# Altium footprint library XU-GENARAL PCB .PcbLib: 1176 footprints (part 13 of 75)
Each footprint in its own frame and in the unit in brackets; x right, y up, seen from the top. Pads: shape width x height; smd on the part's side, far side on the other; paste and mask are expansions set on the pad; w line width, h text height; cw(c..) or ccw(c..) is an arc to the next point about the centre after c.
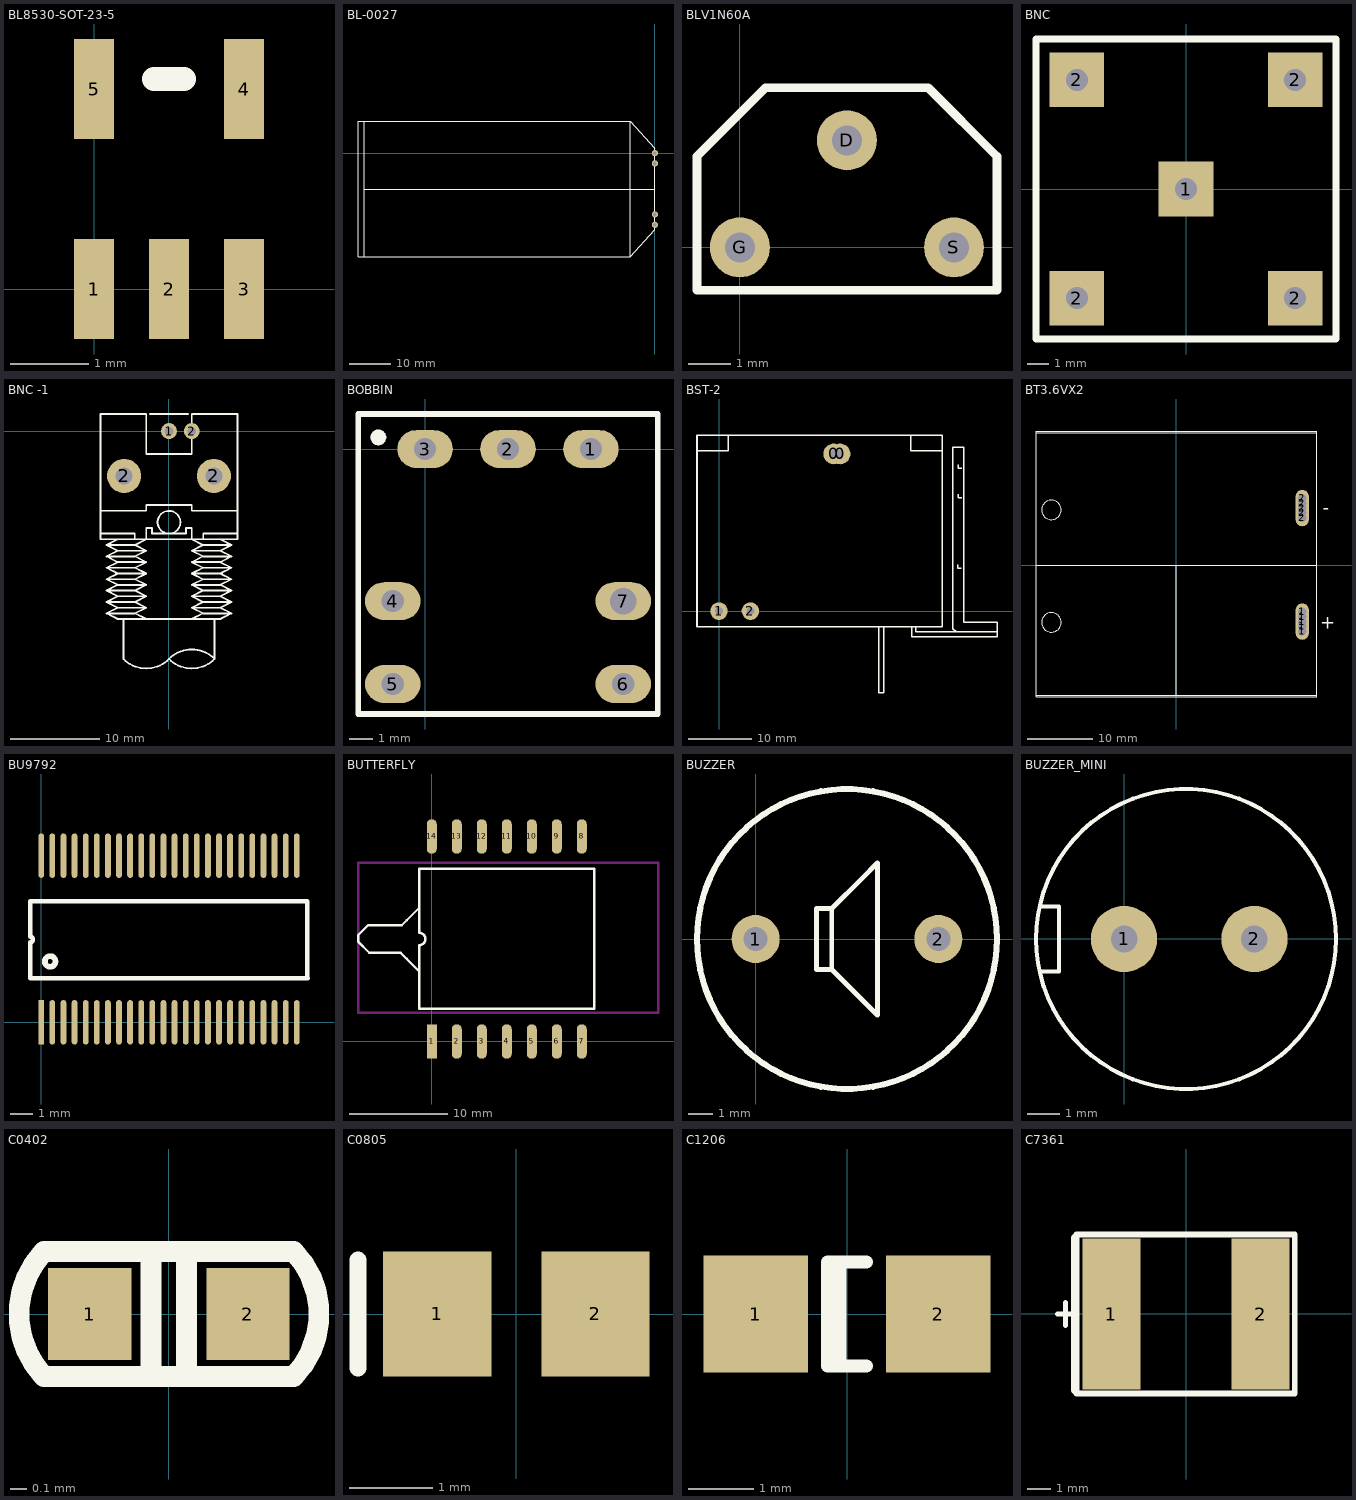
[diagram p12: the footprints below, top view; thin cyan lines are the x and y axes]

## BL8530-SOT-23-5 [mil]
pads (5):
  rect 20x50 smd: 1(0,0) 2(37.5,0) 3(75,0) 4(75,100) 5(0,100)
Top Overlay:
  lines w12: 30,105 45,105

## BL-0027 [mil]
pads (4):
  round 60 hole 35: A(0,-690) A(0,0) K(0,-590) K(0,-100)
Top Overlay:
  lines w10: -2795.28,-345.39 0,-345.39 ; -2795.28,304.21 -2795.28,-995 ; -2795.28,-995 -236.22,-995 ; -2795.28,-995 -2854.33,-995 -2854.33,304.21 -236.22,304.21 ; -236.22,-995 0,-739.09 0,-345.39 ; -236.22,-995 -236.22,304.21 ; -236.22,304.21 0,48.31 0,-345.39
Bottom Overlay:
  lines w10: -2853.43,-739.09 -2657.48,-739.09 -2657.48,-345.39 -2657.48,48.31 -2852.64,48.31 -2852.64,-738.31 ; -433.07,-739.09 -433.07,48.31 -236.22,48.31 -236.22,-739.09 -433.07,-739.09

## BLV1N60A [mil]
pads (3):
  round 56 hole 28: D(100,100) G(0,0) S(200,0)
Top Overlay:
  lines w8: -40,-40 240.16,-40 240.16,40 240.16,84.84 176,149 24,149 -40,85 -40,-40

## BNC [mil]
pads (5):
  rect 100x100 hole 40: 1(0,0) 2(-200,-200) 2(-200,200) 2(200,-200) 2(200,200)
Top Overlay:
  lines w12: -275,-275 275,-275 275,275 -275,275 -275,-275

## BNC -1 [mil]
height 43.31
pads (4):
  round 70 hole 38: 1(0.06,-0.03) 2(100.06,-0.03)
  round 150 hole 74.8: 2(-196.79,-196.88) 2(196.91,-196.88)
Top Overlay:
  circle w8: c0.06,-400.03 r50
  lines w8: -299.94,-450.03 -149.94,-450.03 -149.94,-475.03 ; -299.94,-350.03 -99.94,-350.03 -99.94,-325.03 100.06,-325.03 100.06,-350.03 300.06,-350.03 ; -224.94,-475.03 -274.94,-500.03 ; -200.11,-1000.2 ccw(c-99.94,-900.03) 0.24,-1000.2 ; -199.94,-1000.03 -199.94,-825.03 ; -83.27,74.97 83.4,74.97 ; -0.11,-1000.2 ccw(c100.06,-900.03) 200.24,-1000.2 ; -0.11,-999.86 cw(c100.06,-1100.03) 200.24,-999.86 ; 150.06,-475.03 150.06,-450.03 300.06,-450.03 ; 200.06,-1000.03 200.06,-825.03 ; 225.06,-475.03 275.06,-500.03 ; -274.94,-800.03 -224.94,-775.03 ; -274.94,-800.03 -224.94,-825.03 ; -274.94,-800.03 -149.94,-800.03 ; -274.94,-750.03 -224.94,-725.03 ; -274.94,-750.03 -224.94,-775.03 ; -274.94,-750.03 -149.94,-750.03 ; -274.94,-700.03 -224.94,-675.03 ; -274.94,-700.03 -224.94,-725.03 ; -274.94,-700.03 -149.94,-700.03 ; -274.94,-650.03 -224.94,-625.03 ; -274.94,-650.03 -224.94,-675.03 ; -274.94,-650.03 -149.94,-650.03 ; -274.94,-600.03 -224.94,-575.03 ; -274.94,-600.03 -224.94,-625.03 ; -274.94,-600.03 -149.94,-600.03 ; -274.94,-550.03 -224.94,-525.03 ; -274.94,-550.03 -224.94,-575.03 ; -274.94,-550.03 -149.94,-550.03 ; -274.94,-500.03 -224.94,-525.03 ; -274.94,-500.03 -149.94,-500.03 ; -224.94,-825.03 225.06,-825.03 ; -224.94,-825.03 -99.94,-825.03 -149.94,-800.03 ; -224.94,-775.03 -99.94,-775.03 ; -224.94,-725.03 -99.94,-725.03 ; -224.94,-675.03 -99.94,-675.03 ; -224.94,-625.03 -99.94,-625.03 ; -224.94,-575.03 -99.94,-575.03 ; -224.94,-525.03 -99.94,-525.03 ; -149.94,-800.03 -99.94,-775.03 ; -149.94,-750.03 -99.94,-725.03 ; -149.94,-750.03 -99.94,-775.03 ; -149.94,-700.03 -99.94,-675.03 ; -149.94,-700.03 -99.94,-725.03 ; -149.94,-650.03 -99.94,-625.03 ; -149.94,-650.03 -99.94,-675.03 ; -149.94,-600.03 -99.94,-575.03 ; -149.94,-600.03 -99.94,-625.03 ; -149.94,-550.03 -99.94,-525.03 ; -149.94,-550.03 -99.94,-575.03 ; -149.94,-500.03 -99.94,-475.03 -99.94,-425.03 -74.94,-425.03 -74.94,-450.03 75.06,-450.03 75.06,-425.03 100.06,-425.03 100.06,-475.03 150.06,-500.03 ; -149.94,-500.03 -99.94,-525.03 ; 100.06,-775.03 150.06,-750.03 ; 100.06,-775.03 150.06,-800.03 ; 100.06,-775.03 225.06,-775.03 ; 100.06,-725.03 150.06,-700.03 ; 100.06,-725.03 150.06,-750.03 ; 100.06,-725.03 225.06,-725.03 ; 100.06,-675.03 150.06,-650.03 ; 100.06,-675.03 150.06,-700.03 ; 100.06,-675.03 225.06,-675.03 ; 100.06,-625.03 150.06,-600.03 ; 100.06,-625.03 150.06,-650.03 ; 100.06,-625.03 225.06,-625.03 ; 100.06,-575.03 150.06,-550.03 ; 100.06,-575.03 150.06,-600.03 ; 100.06,-575.03 225.06,-575.03 ; 100.06,-525.03 150.06,-500.03 ; 100.06,-525.03 150.06,-550.03 ; 100.06,-525.03 225.06,-525.03 ; 150.06,-800.03 100.06,-825.03 225.06,-825.03 ; 150.06,-800.03 275.06,-800.03 ; 150.06,-750.03 275.06,-750.03 ; 150.06,-700.03 275.06,-700.03 ; 150.06,-650.03 275.06,-650.03 ; 150.06,-600.03 275.06,-600.03 ; 150.06,-550.03 275.06,-550.03 ; 150.06,-500.03 275.06,-500.03 ; 225.06,-825.03 275.06,-800.03 ; 225.06,-775.03 275.06,-750.03 ; 225.06,-775.03 275.06,-800.03 ; 225.06,-725.03 275.06,-700.03 ; 225.06,-725.03 275.06,-750.03 ; 225.06,-675.03 275.06,-650.03 ; 225.06,-675.03 275.06,-700.03 ; 225.06,-625.03 275.06,-600.03 ; 225.06,-625.03 275.06,-650.03 ; 225.06,-575.03 275.06,-550.03 ; 225.06,-575.03 275.06,-600.03 ; 225.06,-525.03 275.06,-500.03 ; 225.06,-525.03 275.06,-550.03 ; -299.94,-475.03 -299.94,74.97 -99.94,74.97 -99.94,-100.03 100.06,-100.03 100.06,74.97 300.06,74.97 300.06,-475.03 -299.94,-475.03

## BOBBIN [mil]
pads (8):
  oval 95x65 hole 38: 1(283.46,0) 2(141.73,0) 3(0,0) 4(-55.12,-259.84) 5(-55.12,-401.57) 6(338.58,-401.57)
  oval 95x65 hole 45: 7(338.58,-259.84)
  round 27.56 on Top Overlay: ""(-80,20)
Top Overlay:
  lines w10: -114.17,-452.76 397.64,-452.76 ; -114.17,-451.81 -114.17,60 ; -113,60 397.64,60 397.64,-451.81

## BST-2 [mil]
pads (4):
  round 130 hole 50: 0(718.22,984.55) 0(757.59,984.55)
  round 110 hole 50: 1(-0.26,0.03) 2(196.59,0.03)
Top Overlay:
  lines w8: 1001.26,-98.4 1000.86,-511.78 1031.25,-511.78 1031.26,-98.4 ; 1207.25,-98.39 1207.25,-159.39 1384.25,-159.39 1740.25,-159.39 1740.25,-69.39 1533.26,-69.4 1532.25,1025.61 1464.26,1025.6 1463.26,-97.4 1463.26,-109.4 1484.26,-130.4 ; 1232.26,-98.4 1232.25,-130.39 1738.25,-130.39 ; 1495.27,290.1 1495.26,268.55 1517.08,268.56 ; 1496.7,730.9 1496.7,709.36 1518.52,709.36 ; 1496.79,915.31 1496.79,893.76 1518.61,893.76
  lines w10: -138.05,1003.97 58.79,1003.97 58.79,1102.39 ; 1200.53,1102.39 1200.53,1003.97 1397.38,1003.96 ; -138.06,-98.39 -138.06,1102.39 1397.38,1102.39 1397.38,-98.4 -138.06,-98.39

## BT3.6VX2 [mil]
pads (10):
  round 80 hole 51.18: 1(760,-399.06) 1(760,-369.53) 1(760,-310.47) 1(760,-280.94) 2(760,285.94) 2(760,315.47) 2(760,374.53) 2(760,404.06)
  oval 80x220 hole 51.18: 1(760,-340) 2(760,345)
Top Overlay:
  circle w5: c-753.54,334.29 r59.06
  circle w5: c-753.54,-344.84 r59.06
  lines w5: -846.85,0 846.06,0 ; 0,-785 0,0 ; 740.55,-257.36 740.55,-433.43 779.92,-433.43 779.92,-256.26 740.55,-256.26 ; 740.55,427.68 740.55,251.61 779.92,251.61 779.92,428.78 741.65,428.78 ; -846.85,-794.92 846.06,-794.92 846.06,799.57 -846.85,799.57 -846.85,-794.92 ; -846.85,-785 846.06,-785 846.06,809.49 -846.85,809.49 -846.85,-785
  text "+" at 870,-385 h78.74
  text "-" at 885,310 h78.74

## BU9792 [mm]
pads (48):
  rect 0.26x2 smd: 1(0,0)
  oval 0.26x2 smd: 2(0.5,0) 3(1,0) 4(1.5,0) 5(2,0) 6(2.5,0) 7(3,0) 8(3.5,0) 9(4,0) 10(4.5,0) 11(5,0) 12(5.5,0) 13(6,0) 14(6.5,0) 15(7,0) 16(7.5,0) 17(8,0) 18(8.5,0) 19(9,0) 20(9.5,0) 21(10,0) 22(10.5,0) 23(11,0) 24(11.5,0) 25(11.5,7.5) 26(11,7.5) 27(10.5,7.5) 28(10,7.5) 29(9.5,7.5) 30(9,7.5) 31(8.5,7.5) 32(8,7.5) 33(7.5,7.5) 34(7,7.5) 35(6.5,7.5) 36(6,7.5) 37(5.5,7.5) 38(5,7.5) 39(4.5,7.5) 40(4,7.5) 41(3.5,7.5) 42(3,7.5) 43(2.5,7.5) 44(2,7.5) 45(1.5,7.5) 46(1,7.5) 47(0.5,7.5) 48(0,7.5)
Top Overlay:
  circle w0.254: c0.4,2.739 r0.239
  lines w0.2: -0.5,2.01 -0.5,3.6 ccw(c-0.5,3.725) -0.5,3.85 -0.5,5.44
  lines w0.203: -0.5,1.975 12,1.975 ; -0.5,5.44 11.965,5.44 11.965,2.01

## BUTTERFLY [mil]
height 43.31
pads (14):
  rect 40x137.8 smd: 1(0,0)
  oval 40x137.79 smd: 2(100,0) 3(200,0) 4(300,0) 5(400,0) 6(500,0) 7(600,0) 8(600,820) 9(500,820) 10(400,820) 11(300,820) 12(200,820) 13(100,820) 14(0,820)
Top Overlay:
  lines w10: -50,280 -100,330 -125,355 -250,355 -295,400 -295,425 -255,465 -120,465 -100,485 -50,535 ; -50,130 -50,385 ccw(c-50,410) -50,435 -50,690 650,690 650,130 -50,130
Keep-Out Layer:
  lines w10: -295,115 905,115 905,715 -295,715 -295,115

## BUZZER [mm]
height 6.8
pads (2):
  round 2 hole 1: 1(0,0) 2(7.62,0)
Top Overlay:
  circle w0.254: c3.81,0 r6.25
  lines w0.2: 3.175,-1.27 2.54,-1.27 2.54,1.27 3.175,1.27 ; 3.175,-1.27 3.175,1.27 ; 3.175,-1.27 5.08,-3.175 5.08,3.175 4.445,2.54 3.175,1.27

## BUZZER_MINI [mil]
pads (2):
  round 80 hole 32: 1(0,0) 2(157.48,0)
Top Overlay:
  circle w5: c74.8,0 r181.1
  lines w5: -101.26,-39.37 -78.35,-39.37 -78.35,39.37 -101.26,39.37 ; -78.35,0 -78.35,0.39

## C0402 [mil]
pads (2):
  rect 20x22 smd: 1(-19,0) 2(19,0)
Top Overlay:
  lines w5: -4.25,-13 -4.25,13 ; 4.25,-13 4.25,13 ; -30,-15 cw(c-14.19,0) -30,15 30,15 cw(c14.47,0) 30,-15 -30,-15

## C0805 [mm] "Chip Capacitor; Body 2.0 x 1.2 mm (LxW typ)"
height 1.1
pads (2):
  rect 1.3x1.5 smd: 1(-0.95,0) 2(0.95,0)
Top Overlay:
  lines w0.2: -1.9,-0.65 -1.9,0.65

## C1206 [mm] "Chip Capacitor; Body 3.2 x 1.6 mm (LxW typ)"
height 1.35
pads (2):
  rect 1.6x1.8 smd: 1(-1.4,0) 2(1.4,0)
Top Overlay:
  lines w0.2: -0.11,-0.8 -0.11,0.8 ; 0.3,-0.8 -0.3,-0.8 -0.3,0.8 0.3,0.8

## C7361 [mm]
pads (2):
  rect 2.5x6.5 smd: 1(-3.213,0) 2(3.213,0)
Top Overlay:
  lines w0.203: -5.55,0 -4.839,0 ; -5.194,-0.508 -5.194,0.508 ; -4.839,-3.3 -4.839,3.3 ; -4.839,-2.54 -4.686,-2.54 ; -4.686,-3.3 -4.686,3.3 ; -4.686,3.429 4.686,3.429 4.686,-3.429 -3.62,-3.429
  lines w0.254: -3.81,-3.429 4.686,-3.429 4.686,3.429 -3.556,3.429 ; -3.62,-3.429 -4.71,-3.429 -4.839,-3.3 -4.839,3.3 -4.71,3.429 -3.429,3.429